# Altium footprint library Lib_001.PcbLib: 429 footprints (part 9 of 28)
Each footprint in its own frame and in the unit in brackets; x right, y up, seen from the top. Pads: shape width x height; smd on the part's side, far side on the other; paste and mask are expansions set on the pad; w line width, h text height; cw(c..) or ccw(c..) is an arc to the next point about the centre after c.
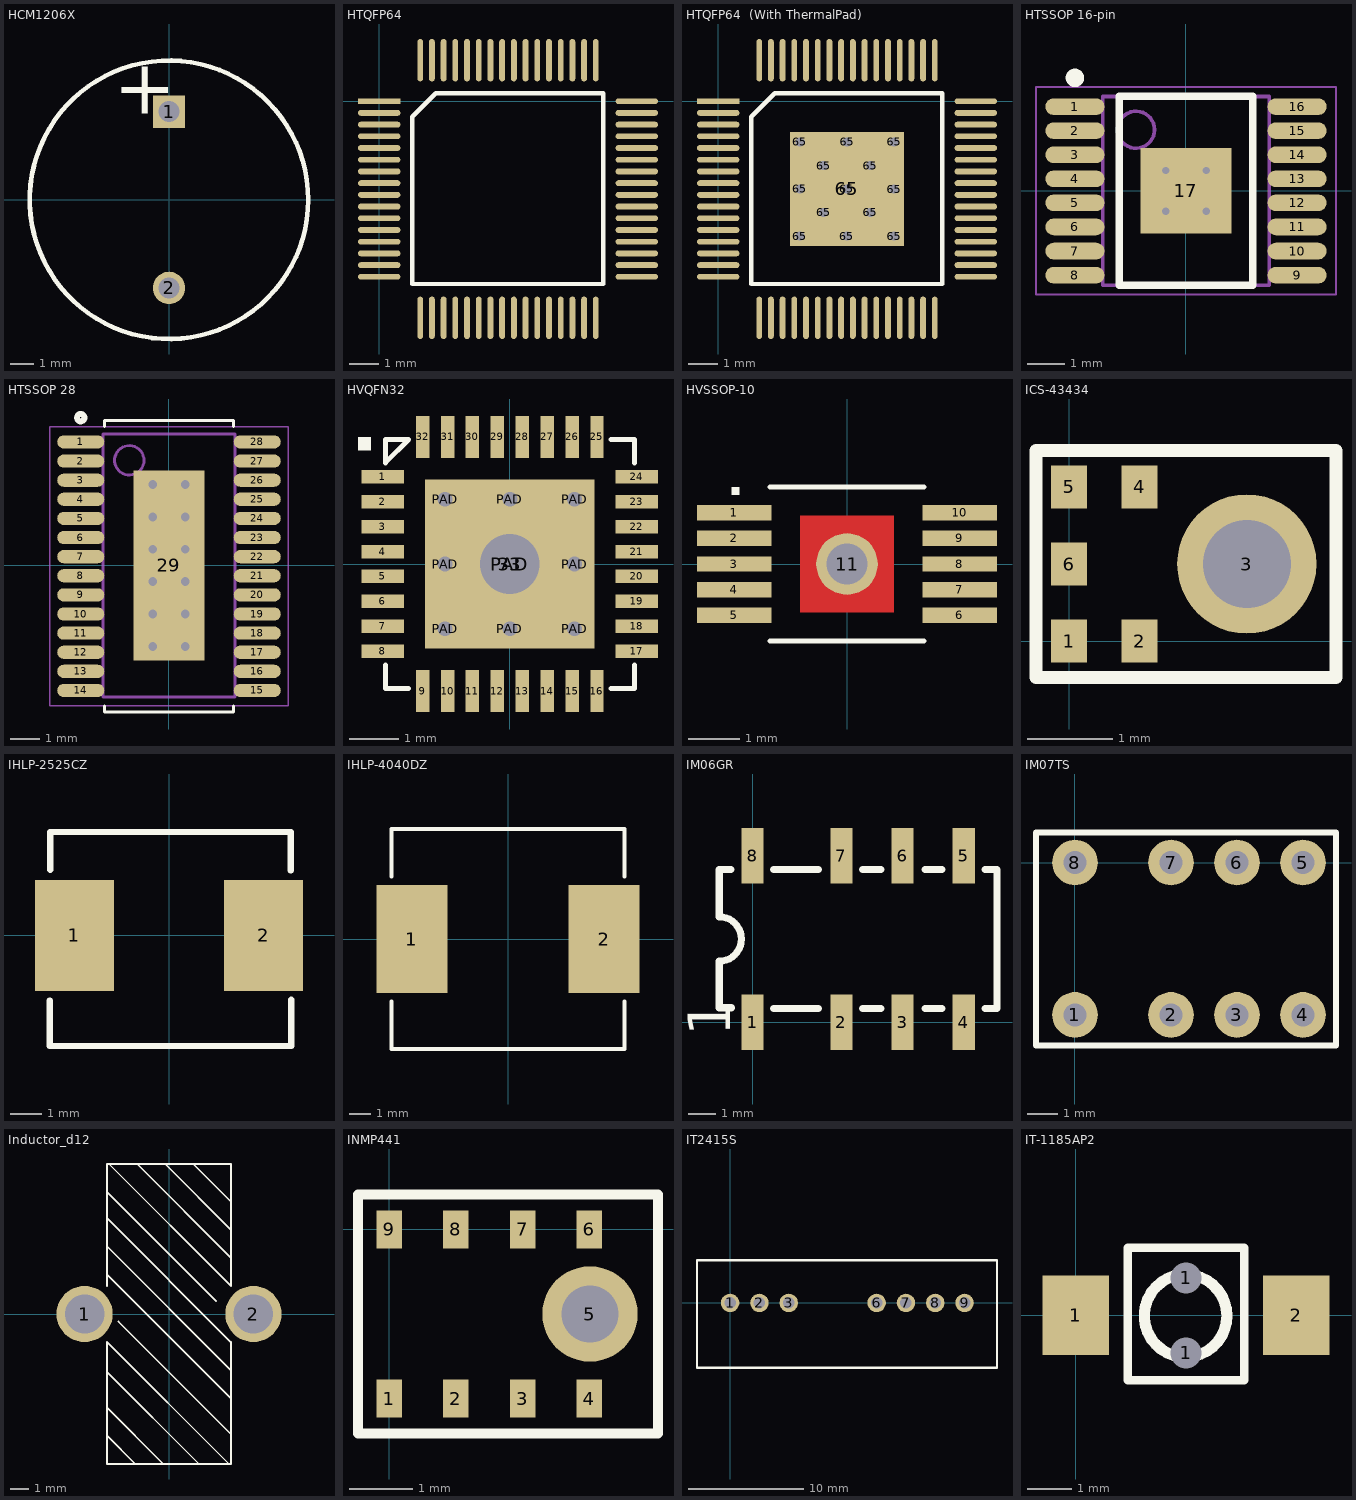
[diagram p8: the footprints below, top view; thin cyan lines are the x and y axes]

## HCM1206X [mm]
pads (2):
  rect 1.4x1.4 hole 0.9 unplated: 1(0,3.8)
  round 1.4 hole 0.9 unplated: 2(0,-3.8)
Top Overlay:
  circle w0.2: c0,-0.001 r6
  text "+" at -2.383,2.926 h4
3D body "User Library-HCM1206X.step": height 9.6, standoff -6.4, extent -6,-6 6,6

## HTQFP64 [mm]
pads (64):
  rect 1.45x0.2 smd: 1(0,0)
  oval 1.45x0.2 smd: 2(0,-0.4) 3(0,-0.8) 4(0,-1.2) 5(0,-1.6) 6(0,-2) 7(0,-2.4) 8(0,-2.8) 9(0,-3.2) 10(0,-3.6) 11(0,-4) 12(0,-4.4) 13(0,-4.8) 14(0,-5.2) 15(0,-5.6) 16(0,-6) 33(8.8,-6) 34(8.8,-5.6) 35(8.8,-5.2) 36(8.8,-4.8) 37(8.8,-4.4) 38(8.8,-4) 39(8.8,-3.6) 40(8.8,-3.2) 41(8.8,-2.8) 42(8.8,-2.4) 43(8.8,-2) 44(8.8,-1.6) 45(8.8,-1.2) 46(8.8,-0.8) 47(8.8,-0.4) 48(8.8,0)
  oval 0.2x1.45 smd: 17(1.4,-7.4) 18(1.8,-7.4) 19(2.2,-7.4) 20(2.6,-7.4) 21(3,-7.4) 22(3.4,-7.4) 23(3.8,-7.4) 24(4.2,-7.4) 25(4.6,-7.4) 26(5,-7.4) 27(5.4,-7.4) 28(5.8,-7.4) 29(6.2,-7.4) 30(6.6,-7.4) 31(7,-7.4) 32(7.4,-7.4) 49(7.4,1.4) 50(7,1.4) 51(6.6,1.4) 52(6.2,1.4) 53(5.8,1.4) 54(5.4,1.4) 55(5,1.4) 56(4.6,1.4) 57(4.2,1.4) 58(3.8,1.4) 59(3.4,1.4) 60(3,1.4) 61(2.6,1.4) 62(2.2,1.4) 63(1.8,1.4) 64(1.4,1.4)
Top Overlay:
  lines w0.15: 1.132,-6.246 7.651,-6.246 7.651,0.271 1.933,0.271 1.132,-0.53 1.132,-6.246
3D body "TSQFP40P900X900-64.STEP": height 1.2, standoff 0, extent -0.1,-7.501 8.9,1.499

## HTQFP64  (With ThermalPad) [mm]
pads (78):
  rect 1.45x0.2 smd: 1(0,0)
  oval 1.45x0.2 smd: 2(0,-0.4) 3(0,-0.8) 4(0,-1.2) 5(0,-1.6) 6(0,-2) 7(0,-2.4) 8(0,-2.8) 9(0,-3.2) 10(0,-3.6) 11(0,-4) 12(0,-4.4) 13(0,-4.8) 14(0,-5.2) 15(0,-5.6) 16(0,-6) 33(8.8,-6) 34(8.8,-5.6) 35(8.8,-5.2) 36(8.8,-4.8) 37(8.8,-4.4) 38(8.8,-4) 39(8.8,-3.6) 40(8.8,-3.2) 41(8.8,-2.8) 42(8.8,-2.4) 43(8.8,-2) 44(8.8,-1.6) 45(8.8,-1.2) 46(8.8,-0.8) 47(8.8,-0.4) 48(8.8,0)
  oval 0.2x1.45 smd: 17(1.4,-7.4) 18(1.8,-7.4) 19(2.2,-7.4) 20(2.6,-7.4) 21(3,-7.4) 22(3.4,-7.4) 23(3.8,-7.4) 24(4.2,-7.4) 25(4.6,-7.4) 26(5,-7.4) 27(5.4,-7.4) 28(5.8,-7.4) 29(6.2,-7.4) 30(6.6,-7.4) 31(7,-7.4) 32(7.4,-7.4) 49(7.4,1.4) 50(7,1.4) 51(6.6,1.4) 52(6.2,1.4) 53(5.8,1.4) 54(5.4,1.4) 55(5,1.4) 56(4.6,1.4) 57(4.2,1.4) 58(3.8,1.4) 59(3.4,1.4) 60(3,1.4) 61(2.6,1.4) 62(2.2,1.4) 63(1.8,1.4) 64(1.4,1.4)
  round 0.6 hole 0.3 unplated: 65(2.79,-4.608) 65(2.791,-2.999) 65(2.792,-1.39) 65(3.6,-3.8) 65(3.6,-2.2) 65(4.399,-4.609) 65(4.4,-3) 65(4.401,-1.391) 65(5.2,-3.8) 65(5.2,-2.2) 65(6.008,-4.61) 65(6.009,-3.001) 65(6.01,-1.392)
  rect 3.9x3.9 smd: 65(4.4,-3)
Top Overlay:
  lines w0.15: 1.132,-6.246 1.132,-0.53 1.933,0.271 7.651,0.271 7.651,-6.246 1.132,-6.246
3D body "TSQFP40P900X900-64.STEP": height 1.2, standoff 0, extent -0.1,-7.501 8.9,1.499

## HTSSOP 16-pin [mm] "TSOP, 16-Leads, Body 5,00x4,40mm, Pitch 0,65mm, Thermal Pad 2,31.2x2,46.2mm, IPC Medium Density"
height 1.2
pads (17):
  oval 1.6x0.45 smd: 1(-3,2.275) 2(-3,1.625) 3(-3,0.975) 4(-3,0.325) 5(-3,-0.325) 6(-3,-0.975) 7(-3,-1.625) 8(-3,-2.275) 9(3,-2.275) 10(3,-1.625) 11(3,-0.975) 12(3,-0.325) 13(3,0.325) 14(3,0.975) 15(3,1.625) 16(3,2.275)
  rect 2.46x2.31 all layers, no hole: 17(0,0)
via 0.55,-0.55 diameter 0.5 hole 0.2
via -0.55,-0.55 diameter 0.5 hole 0.2
via 0.55,0.55 diameter 0.5 hole 0.2
via -0.55,0.55 diameter 0.5 hole 0.2
Top Overlay:
  circle w0.25: c-3,3.05 r0.125
  lines w0.2: -1.8,-2.55 1.8,-2.55 1.8,2.55 -1.8,2.55 -1.8,-2.55
Mechanical 13:
  circle w0.1: c-1.35,1.65 r0.5
  lines w0.1: -2.25,-2.55 2.25,-2.55 2.25,2.55 -2.25,2.55 -2.25,-2.55
Mechanical 15:
  lines w0.05: -4.05,-2.8 4.05,-2.8 4.05,2.8 -4.05,2.8 -4.05,-2.8
  lines w0.1: -0.5,0 0.5,0 ; 0,-0.5 0,0.5
3D body "User Library-SSOP16.step": height 1.1, standoff 0, extent -2.927,-2.459 3.067,2.519

## HTSSOP 28 [mm]
height 1.2
pads (41):
  oval 1.6x0.45 smd: 1(-3,4.2) 2(-3,3.55) 3(-3,2.9) 4(-3,2.25) 5(-3,1.6) 6(-3,0.95) 7(-3,0.3) 8(-3,-0.35) 9(-3,-1) 10(-3,-1.65) 11(-3,-2.3) 12(-3,-2.95) 13(-3,-3.6) 14(-3,-4.25) 15(3,-4.25) 16(3,-3.6) 17(3,-2.95) 18(3,-2.3) 19(3,-1.65) 20(3,-1) 21(3,-0.35) 22(3,0.3) 23(3,0.95) 24(3,1.6) 25(3,2.25) 26(3,2.9) 27(3,3.55) 28(3,4.2)
  round 0.1 hole 0.3 unplated: 29(-0.55,-2.75) 29(-0.55,-1.65) 29(-0.55,-0.55) 29(-0.55,0.55) 29(-0.55,1.65) 29(-0.55,2.75) 29(0.55,-2.75) 29(0.55,-1.65) 29(0.55,-0.55) 29(0.55,0.55) 29(0.55,1.65) 29(0.55,2.75)
  rect 2.4x6.46 all layers, no hole: 29(0,0)
Top Overlay:
  circle w0.2: c-3,5.025 r0.125
  lines w0.1: -2.2,-4.775 -2.2,-4.975 2.2,-4.975 2.2,-4.775 ; -2.2,4.725 -2.2,4.925 2.2,4.925 2.2,4.725
Mechanical 13:
  circle w0.1: c-1.35,3.575 r0.5
  lines w0.1: -2.25,-4.475 2.25,-4.475 2.25,4.475 -2.25,4.475 -2.25,-4.475
Mechanical 15:
  lines w0.05: -4.05,-4.775 4.05,-4.775 4.05,4.725 -4.05,4.725 -4.05,-4.775
  lines w0.1: -0.5,2.2 0.5,2.2 ; 0,1.7 0,2.7
3D body "User Library-PWP (R-PDSO-G28).STEP": height 1.2, standoff 0, extent -3.31,-4.9 3.31,4.9

## HVQFN32 [mm]
height 1
pads (42):
  rect 0.85x0.27 smd: 1(-2.55,1.75) 2(-2.55,1.25) 3(-2.55,0.75) 4(-2.55,0.25) 5(-2.55,-0.25) 6(-2.55,-0.75) 7(-2.55,-1.25) 8(-2.55,-1.75) 17(2.55,-1.75) 18(2.55,-1.25) 19(2.55,-0.75) 20(2.55,-0.25) 21(2.55,0.25) 22(2.55,0.75) 23(2.55,1.25) 24(2.55,1.75)
  rect 0.27x0.85 smd: 9(-1.75,-2.55) 10(-1.25,-2.55) 11(-0.75,-2.55) 12(-0.25,-2.55) 13(0.25,-2.55) 14(0.75,-2.55) 15(1.25,-2.55) 16(1.75,-2.55) 25(1.75,2.55) 26(1.25,2.55) 27(0.75,2.55) 28(0.25,2.55) 29(-0.25,2.55) 30(-0.75,2.55) 31(-1.25,2.55) 32(-1.75,2.55)
  rect 3.4x3.4 smd: 33(0,0)
  round 0.6 hole 0.3: PAD(-1.3,-1.3) PAD(-1.3,0) PAD(-1.3,1.3) PAD(0,-1.3) PAD(0,1.3) PAD(1.3,-1.3) PAD(1.3,0) PAD(1.3,1.3)
  round 1.5 hole 1.2: PAD(0,0)
Top Overlay:
  region: -3.048,2.54 -2.794,2.54 -2.794,2.286 -3.048,2.286
  lines w0.1: -2.5,-2.032 -2.5,-2.5 -2.032,-2.5 ; 2.032,-2.5 2.5,-2.5 2.5,-2.032 ; 2.032,2.5 2.5,2.5 2.5,2.032 ; -2.5,2.032 -2.5,2.5 -2.032,2.5 -2.5,2.032
3D body "User Library-HVQFN-32-1.step": height 0.82, standoff -0.03, extent -2.5,-2.5 2.5,2.5

## HVSSOP-10 [mm]
pads (11):
  rect 1.45x0.3 smd mask+0.051: 1(-2.2,1) 2(-2.2,0.5) 3(-2.2,0) 4(-2.2,-0.5) 5(-2.2,-1) 6(2.2,-1) 7(2.2,-0.5) 8(2.2,0) 9(2.2,0.5) 10(2.2,1)
  round 1.2 hole 0.8: 11(0,0)
Top Layer:
  rectangle: -0.915,-0.946 0.915,0.946
Top Overlay:
  rectangle: -2.25,1.35 -2.1,1.5
  lines w0.1: -1.5,-1.5 1.5,-1.5 ; -1.5,1.5 1.5,1.5
Top Solder:
  rectangle: -0.926,-0.95 0.922,0.961
3D body "DGQ0010A.stp": height 0.96, standoff 0, extent -2.462,-1.5 2.463,1.5

## ICS-43434 [mm]
pads (6):
  rect 0.422x0.5 smd: 1(0,0) 2(0.822,0) 4(0.822,1.8) 5(0,1.8) 6(0,0.9)
  round 1.625 smd: 3(2.074,0.9)
via 2.074,0.9 diameter 1.025 hole 1.025
Top Overlay:
  lines w0.15: 3.11,-0.425 2.074,-0.425 -0.386,-0.425 -0.386,2.225 2.074,2.225 3.11,2.225 ; 3.114,-0.425 3.114,0.9 3.114,2.225
3D body: height 0.98, standoff 0, extent -0.386,-0.425 3.11,2.225

## IHLP-2525CZ [mm] "Commercial Inductors, High Saturation Series"
pads (2):
  rect 2.5x3.5 smd: 1(-3,0) 2(2.97,0)
Top Overlay:
  lines w0.2: -3.783,-2.053 -3.783,-3.493 3.841,-3.493 3.841,-2.033 ; -3.765,2.073 -3.765,3.265 3.832,3.265 3.832,2.05
3D body "User Library-IHLP.STEP": height 3.26, standoff 0.03, extent -3.779,-3.514 3.821,3.286

## IHLP-4040DZ [mm] "Commercial Inductors, High Saturation Series"
pads (2):
  rect 3.3x5 smd: 1(-4.45,0) 2(4.45,0)
Top Overlay:
  lines w0.2: -5.4,-2.895 -5.4,-5.1 5.4,-5.1 5.4,-2.895 ; -5.4,2.895 -5.4,5.1 5.4,5.1 5.4,2.895
3D body "52665.stp": height 3.88, standoff 0, extent -5.388,-5.131 5.234,5.085

## IM06GR [mm]
height 5.65
pads (8):
  rect 0.8x2 smd: 1(0,0) 2(3.2,0) 3(5.4,0) 4(7.6,0) 5(7.6,6) 6(5.4,6) 7(3.2,6) 8(0,6)
Top Overlay:
  lines w0.254: -0.775,5.5 -1.2,5.5 -1.2,3.8 cw(c-1.2,3) -0.4,3 cw(c-1.2,3) -1.2,2.2 -1.2,0.525 -0.75,0.525 ; 0.75,0.5 2.375,0.5 ; 0.75,5.5 2.375,5.5 ; 3.95,0.5 4.625,0.5 ; 3.95,5.5 4.625,5.5 ; 6.2,0.5 6.825,0.5 ; 6.2,5.5 6.825,5.5 ; 8.375,0.5 8.8,0.5 8.8,5.5 8.375,5.5
  text "1" at -0.8,-0.5 h1.52
3D body "User Library-IM07CGR.step": height -0.4, standoff -6.05, extent -1.2,-0.858 8.8,6.658

## IM07TS [mil] "relay IM series"
pads (8):
  round 60 hole 30: 1(0,-200) 2(125.98,-200) 3(212.6,-200) 4(299.21,-200) 5(299.21,0) 6(212.6,0) 7(125.98,0) 8(0,0)
Top Overlay:
  lines w7.87: -51.18,-240.16 -51.18,39.37 342.52,39.37 342.52,-240.16 -51.18,-240.16
3D body "48w7315_5-1462037-3.stp": height 183.07, standoff -165.35, extent -47.24,-216.53 346.46,19.69

## Inductor_d12 [mm]
pads (2):
  round 3 hole 2.1: 1(-4.5,0) 2(4.5,0)
Top Overlay:
  lines w0.1: -3.3,-3 -3.3,-3.1 1.6,-8 ; -3.3,1.5 -3.3,8 ; -3.3,2.1 3.3,-4.5 ; -3.3,3.6 3.3,-3 ; -3.3,5.1 3.3,-1.5 ; -2.7,-0.4 3.3,-6.4 3.3,-6.5 ; -1.8,-8 -3.3,-6.5 ; -1.7,8 3.3,3 ; -0.3,-8 -3.3,-5 ; -0.2,8 3.3,4.5 ; 1.3,8 3.3,6 ; 2.5,0.7 -3.3,6.5 ; 3.2,-8 -3.3,-1.5 ; -3.3,-6.5 -3.3,-6.5 ; -3.3,-5 -3.3,-5 ; -3.3,-1.5 -3.3,-1.5 ; -3.3,-1.5 -3.3,-8 3.3,-8 3.3,-1.5 ; -3.3,6.5 -3.3,6.5 ; -3.3,8 -3.2,8 3.3,1.5 3.3,8 -3.3,8 ; 3.3,-3 3.3,-3 ; 3.3,-1.5 3.3,-1.5 ; 3.3,4.5 3.3,4.5 ; 3.3,6 3.3,6

## INMP441 [mm]
pads (9):
  rect 0.4x0.6 smd: 1(0,-2.66) 2(1.05,-2.66) 3(2.1,-2.66) 4(3.15,-2.66) 6(3.15,0) 7(2.1,0) 8(1.05,0) 9(0,0)
  round 1.5 smd: 5(3.16,-1.33)
via 3.16,-1.33 diameter 0.9 hole 0.9
Top Overlay:
  lines w0.15: -0.49,-3.21 4.23,-3.21 4.23,-1.33 4.23,0.55 -0.49,0.55 -0.49,-3.21
3D body "User Library-inmp441_b.step": height 1.05, standoff 0, extent -0.6,-3.27 4.22,0.59

## IT2415S [mm]
pads (7):
  round 1.6 hole 1: 1(0,0) 2(2.54,0) 3(5.08,0) 6(12.7,0) 7(15.24,0) 8(17.78,0) 9(20.32,0)
Top Overlay:
  lines w0.2: -2.87,-5.61 23.13,-5.61 23.13,-2.61 23.13,3.69 -2.87,3.69 -2.87,-2.61 -2.87,-5.61

## IT-1185AP2 [mm]
pads (4):
  rect 1.5x1.8 smd: 1(0,0) 2(5,0)
  round 0.6 hole 0.7: 1(2.5,-0.85) 1(2.5,0.85)
Top Overlay:
  circle w0.254: c2.49,-0.01 r0.936
  lines w0.2: 1.18,-1.47 1.18,0.03 1.18,1.53 3.82,1.53 3.82,0.03 3.82,-1.47 1.18,-1.47
3D body "User Library-Pushbutton3x4x2.step": height 2, standoff 0, extent 0.065,-1.466 4.965,1.434